# Altium schematic symbol library lib_datalogger.SchLib: 1246 symbols (part 2 of 16) (continued)
## CMP-002-00017-2
designator P?, comment 4-103777-0
Male Header, Pitch 2.54 mm, 2 x 40 Position, Height 8.13 mm, Tail Length 2.29 mm, -65 to 105 degC, RoHS, Bulk; Manufacturer: TE Connectivity; Rows: 2; Current Rating: 3A; Contact Material: Bronze; Contact Plating: Tin; Case/Package: 4-103777-0; Colour: Black; Packaging: Bulk; Datasheet URL: http://www.onlinecomponents.com/datasheet/41037770.aspx?p=10364676; Package Description: Male Header, Pitch 2.54 mm, 2 x 40 Position, Height 8.13 mm, Tail Length 2.29 mm; Datasheet Version: Rev. 6-04, 03/2006; Max Operating Temperature: 105°C; Contact Finish: Lead; RoHS Compliant: True; Package URL: http://www.mouser.com/ds/2/418/NG_CD_103777_F2-615203.pdf; Connector Type: Header; Lead Pitch: 2.54mm; Min Operating Temperature: -65°C; Gender: Male; Mounting Technology: TH; Pins: 80; Manufacturer URL: http://www.te.com/; Contact Gender: Male; Package Quantity: 50; Package Reference: 4-103777-0
footprint TECO-4-103777-0_V (THD, 80-Leads, Body 101.19x4.88mm, Pitch 2.54mm)
pins: 1, 2, 3, 4, 5, 6, 7, 8, 9, 10, 11, 12, 13, 14, 15, 16, 17, 18, 19, 20, 21, 22, 23, 24, 25, 26, 27, 28, 29, 30, 31, 32, 33, 34, 35, 36, 37, 38, 39, 40, 41, 42, 43, 44, 45, 46, 47, 48, 49, 50, 51, 52, 53, 54, 55, 56, 57, 58, 59, 60, 61, 62, 63, 64, 65, 66, 67, 68, 69, 70, 71, 72, 73, 74, 75, 76, 77, 78, 79, 80

## CMP-002-00018-2
designator P?, comment 5-146130-2
Male Header, Pitch 2.54 mm, 2 x 3 Position, Height 8.13 mm, -65 to 125 degC, RoHS, Tube; Manufacturer: TE Connectivity; Max Operating Temperature: 125°C; Datasheet Version: Oct-15; Package Description: Male Header, Pitch 2.54 mm, 2 x 3 Position, Height 8.13 mm; Case/Package: 5-146130-2; Datasheet URL: http://www.te.com/commerce/DocumentDelivery/DDEController?Action=showdoc&DocId=Customer+Drawing%7F146130%7FM%7Fpdf%7FEnglish%7FENG_CD_146130_M.pdf%7F5-146130-2; Manufacturer URL: http://www.te.com/; Connector Type: Header; Gender: Male; Mounting Technology: SM; Min Operating Temperature: -65°C; RoHS Compliant: Unknown; Package Reference: 5-146130-2
footprint TECO-5-146130-2_V (Header, 6-Leads, Body 7.21x4.88mm, Pitch 2.54mm)
pins: 1, 2, 3, 4, 5, 6

## CMP-002-00019-2
designator J?, comment 5-534237-8
Female Receptacle, Pitch 2.54 mm, 1 x 10 Position, Height 8.64 mm, Tail Length 2.92 mm, -65 to 105 degC, RoHS, Tube; Manufacturer: TE Connectivity; Max Contact Resistance: 12mohm; Connector Type: Header; Current Rating: 2A; Voltage Rating: 750V; Rows: 1; Datasheet Version: Apr-13; Contact Plating: Gold; Min Operating Temperature: -65°C; Manufacturer URL: http://www.te.com/; Mounting Technology: TH; Contact Material: Bronze; RoHS Compliant: True; Packaging: Rail/Tube; Contact Finish: Gold; Pins: 10; Case/Package: 5-534237-8; Max Operating Temperature: 105°C; Lead Pitch: 2.54mm; Gender: Female; Package Quantity: 22; Colour: Black; Package Description: Female Receptacle, Pitch 2.54 mm, 1 x 10 Position, Height 8.64 mm, Tail Length 2.92 mm; Package Reference: 5-534237-8; Datasheet URL: http://www.te.com/commerce/DocumentDelivery/DDEController?Action=showdoc&DocId=Customer+Drawing%7F534237%7FR5%7Fpdf%7FEnglish%7FENG_CD_534237_R5.pdf%7F5-534237-8
footprint TECO-5-534237-8_V (Receptacle, 10-Leads, Body 25.4x3.56mm, Pitch 2.54mm)
pins: 1, 2, 3, 4, 5, 6, 7, 8, 9, 10

## CMP-002-00020-2
designator P?, comment 68021-210HLF
Male Header, Pitch 2.54 mm, 2 x 5 Position, Height 4.83 mm, Tail Length 3.05 mm, Bulk; Manufacturer: FCI Electronics; Datasheet URL: http://portal.fciconnect.com/Comergent//fci/drawing/68020.pdf; Case/Package: 68021-210HLF-10; Manufacturer URL: http://portal.fciconnect.com/; Connector Type: Header; Mounting Technology: TH; Datasheet Version: Rev. BM, 04/2015; Package Description: Male Header, Pitch 2.54 mm, 2 x 5 Position, Height 4.83 mm, Tail Length 3.05 mm; Gender: Male; RoHS Compliant: Unknown; Package Reference: 68021-210HLF-10
footprint FCI-68021-210HLF-10_V (THD, 10-Leads, Body 12.7x2.54mm, Pitch 2.54mm)
pins: 1, 2, 3, 4, 5, 6, 7, 8, 9, 10

## CMP-002-00021-2
designator P?, comment 77311-462K05LF
Male Header, Pitch 2.54 mm, 1 x 5 Position, Height 16.24 mm, Tail Length 3.05 mm, -65 to 125 degC, RoHS, Tape and Reel; Manufacturer: FCI Electronics; Connector Type: Header; Manufacturer URL: http://portal.fciconnect.com/; Datasheet URL: http://portal.fciconnect.com/Comergent//fci/drawing/77311.pdf; Gender: Male; Case/Package: 77311-5; Package Reference: 77311-5; Datasheet Version: Rev. CK, 07/2016; Package Description: Male Header, Pitch 2.54 mm, 1 x 5 Position, Height 16.24 mm, Tail Length 3.05 mm; RoHS Compliant: Unknown; Mounting Technology: TH
footprint FCI-77311-5_V (THD, 5-Leads, Body 12.7x2.4mm, Pitch 2.54mm)
pins: 1 DTR, 2 RXI, 3 TXO, 4 VCC, 5 CTS

## CMP-002-00022-2
designator P?, comment 9-146281-0
Male Header, Pitch 2.54 mm, 1 x 40 Position, Height 8.21 mm, Tail Length 3.05 mm, -65 to 105 degC, RoHS, Bulk; Manufacturer: TE Connectivity; Current Rating: 3A; Rows: 1; Datasheet URL: http://www.te.com/commerce/DocumentDelivery/DDEController?Action=showdoc&DocId=Customer+Drawing%7F146281%7FG%7Fpdf%7FEnglish%7FENG_CD_146281_G_146281_1_c.dwg.pdf%7F9-146281-0; Contact Plating: Gold; Packaging: Tray; Lead Pitch: 2.54mm; Max Operating Temperature: 105°C; Manufacturer URL: http://www.te.com/; Connector Type: Header; Package Reference: 9-146281-0; Gender: Male; Package Description: Male Header, Pitch 2.54 mm, 1 x 40 Position, Height 8.21 mm, Tail Length 3.05 mm; Package Quantity: 100; Datasheet Version: Rev. G, 07/2014; Contact Gender: Male; Colour: Black; RoHS Compliant: True; Min Operating Temperature: -65°C; Mounting Technology: TH; Contact Material: Bronze; Package URL: http://www.te.com/commerce/DocumentDelivery/DDEController?Action=showdoc&DocId=Catalog+Section%7F1307819_SECTION_5%7F0908%7Fpdf%7FEnglish%7FENG_CS_1307819_SECTION_5_0908.pdf%7F9-146281-0; Case/Package: 9-146281-0; Contact Finish: Gold; Pins: 40
footprint TECO-9-146281-0_V (Header, 40-Leads, Body 101.2x2.34mm, Pitch 2.54mm)
pins: 1, 2, 3, 4, 5, 6, 7, 8, 9, 10, 11, 12, 13, 14, 15, 16, 17, 18, 19, 20, 21, 22, 23, 24, 25, 26, 27, 28, 29, 30, 31, 32, 33, 34, 35, 36, 37, 38, 39, 40

## CMP-002-00023-2
designator J?, comment 929850-01-10-RA
Female Header, Pitch 2.54 mm, 1 x 10 Position, Height 8.26 mm, Tail Length 3.18 mm, -40 to 105 degC, RoHS, Bulk; Manufacturer: 3M; Current Rating: 1A; Datasheet Version: Jun-13; Contact Finish: Gold; Package Description: Female Header, Pitch 2.54 mm, 1 x 10 Position, Height 8.26 mm, Tail Length 3.18 mm; Mounting Technology: TH; Max Operating Temperature: 105°C; Pins: 10; Lead Pitch: 2.54mm; RoHS Compliant: True; Contact Plating: Gold; Min Operating Temperature: -40°C; Colour: Black; Contact Gender: Female; Package Reference: 929850-01-10-RA; Gender: Female; Case/Package: 929850-01-10-RA; Packaging: Bulk; Package Quantity: 300; Datasheet URL: http://multimedia.3m.com/mws/media/22500O/3mtm-boardmount-skt-100-100x-100strt-sldr-tails-ts0815.pdf; Connector Type: Header; Contact Material: Copper; Manufacturer URL: http://www.3m.com/
footprint 3M-929850-01-10-RA_V (THD, 10-Leads, Body 25.4x2.54mm, Pitch 2.54mm)
pins: 1, 2, 3, 4, 5, 6, 7, 8, 9, 10

## CMP-002-00024-2
designator P?, comment 95278-101A06LF
Male Header, Pitch 2.54 mm, 2 x 3 Position, Height 14.4 mm, RoHS, Tape and Reel; Manufacturer: Amphenol; Package Reference: 95278-101A06LF; Package Description: Male Header, Pitch 2.54 mm, 2 x 3 Position, Height 14.4 mm; RoHS Compliant: Unknown; Case/Package: 95278-101A06LF; Connector Type: Header; Mounting Technology: SM; Gender: Male; Datasheet URL: http://portal.fciconnect.com/Comergent//fci/drawing/95278.pdf; Datasheet Version: Rev. AC, 03/2016
footprint AMPM-95278-101A06LF_V (SMD, 6-Leads, Body 7.26x4.83mm, Pitch 2.54mm)
pins: 1, 2, 3, 4, 5, 6

## CMP-002-00025-2
designator P?, comment B2P-VH(LF)(SN)
Male Header, Pitch 3.96 mm, 1 x 2 Position, Height 10.9 mm, Tail Length 3.7 mm, -25 to 85 degC, RoHS, Bulk; Manufacturer: JST; Case/Package: B2P-VH(LF)(SN); Connector Type: Header; Mounting Technology: TH; Package Reference: B2P-VH(LF)(SN); Package Description: Male Header, Pitch 3.96 mm, 1 x 2 Position, Height 10.9 mm, Tail Length 3.7 mm; Max Operating Temperature: 85°C; Manufacturer URL: http://www.jst.com/home2.html; RoHS Compliant: Unknown; Datasheet Version: May-16; Gender: Male; Min Operating Temperature: -25°C; Datasheet URL: http://www.jst-mfg.com/product/pdf/eng/eVH.pdf
footprint JST-B2P-VH(LF)(SN)_V (THD, 2-Leads, Body 8.5x7.86mm, Pitch 3.96mm)
pins: 1, 2

## CMP-002-00026-2
designator P?, comment B3P-VH(LF)(SN)
Male Header, Pitch 3.96 mm, 1 x 3 Position, Height 10.9 mm, Tail Length 3.7 mm, -25 to 85 degC, RoHS, Bulk; Manufacturer: JST; Case/Package: B3P-VH(LF)(SN); Connector Type: Header; Datasheet Version: May-16; Mounting Technology: TH; Package Description: Male Header, Pitch 3.96 mm, 1 x 3 Position, Height 10.9 mm, Tail Length 3.7 mm; Gender: Male; Manufacturer URL: http://www.jst.com/home2.html; Package Reference: B3P-VH(LF)(SN); Datasheet URL: http://www.jst-mfg.com/product/pdf/eng/eVH.pdf; Min Operating Temperature: -25°C; Max Operating Temperature: 85°C; RoHS Compliant: Unknown
footprint JST-B3P-VH(LF)(SN)-3_V (Connector, 3-Leads, Body 8.5x11.82mm, Pitch 3.96mm)
pins: 1, 2, 3

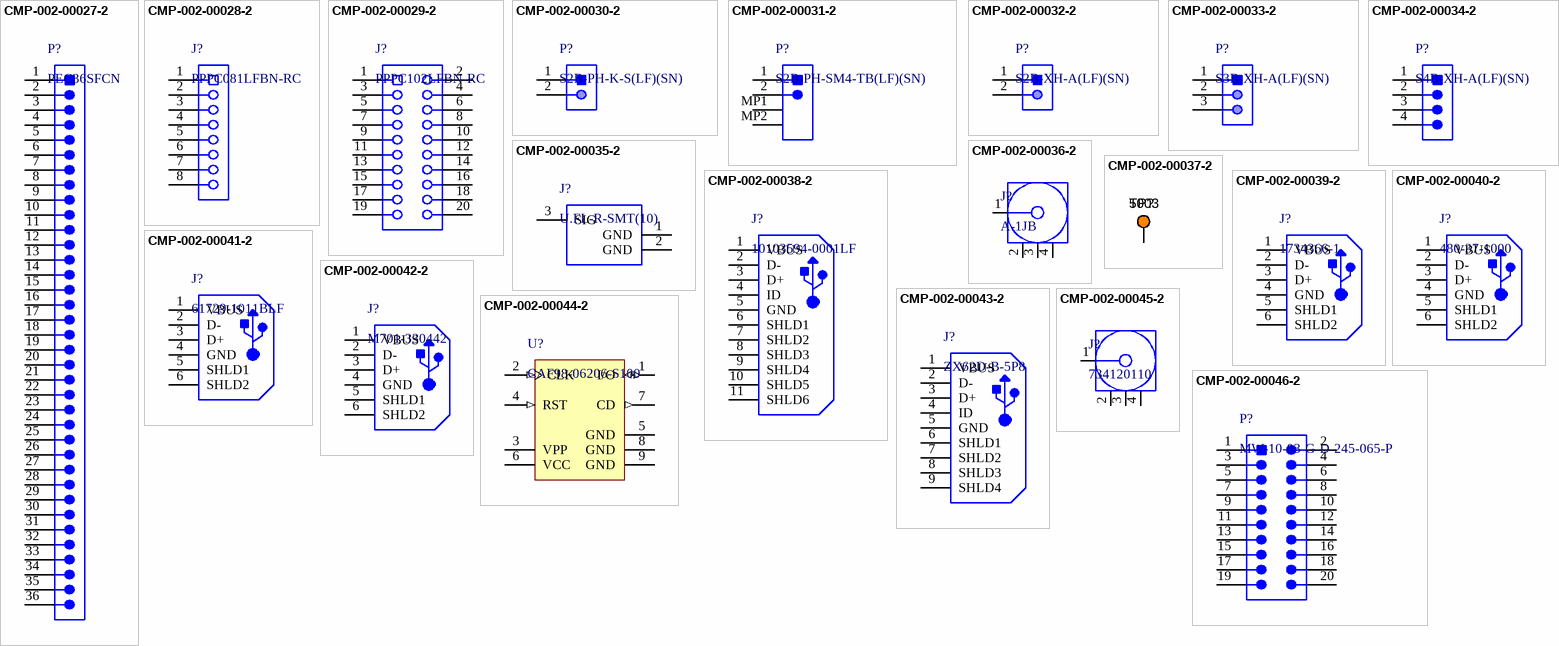
[diagram p4: symbols CMP-002-00027-2 to CMP-002-00046-2]

## CMP-002-00027-2
designator P?, comment PEC36SFCN
Male Header, Pitch 2.54 mm, 1 x 36 Position, Height 10.62 mm, Tail Length 8.13 mm, -65 to 125 degC, RoHS, Bulk; Manufacturer: Sullins; Contact Finish: Tin; Datasheet Version: Apr-13; Pins: 36; Datasheet URL: http://disti-assets.s3.amazonaws.com/testco-inc/files/datasheets/17515.pdf; RoHS Compliant: True; Case/Package: PEC36SFCN; Package Reference: PEC36SFCN; Colour: Black; Gender: Male; Connector Type: Header; Package Quantity: 1; Packaging: Bulk; Mounting Technology: TH; Package Description: Male Header, Pitch 2.54 mm, 1 x 36 Position, Height 10.62 mm, Tail Length 8.13 mm; Package URL: http://www.sullinscorp.com/drawings/77____C___S___N-OMIT,_M500,_STRAIGHT,_C10436.pdf; Lead Pitch: 0.1inch
footprint SLIN-PEC36SFCN_V (THD, 36-Leads, Body 91.44x2.54mm, Pitch 2.54mm)
pins: 1, 2, 3, 4, 5, 6, 7, 8, 9, 10, 11, 12, 13, 14, 15, 16, 17, 18, 19, 20, 21, 22, 23, 24, 25, 26, 27, 28, 29, 30, 31, 32, 33, 34, 35, 36

## CMP-002-00028-2
designator J?, comment PPPC081LFBN-RC
Female Header, Pitch 2.54 mm, 1 x 8 Position, Height 8.5 mm, Tail Length 3.2 mm, -40 to 105 degC, RoHS, Bulk; Manufacturer: Sullins; Package Reference: PPPC081LFBN-RC; Connector Type: Header; Datasheet Version: Jan-15; Package Description: Female Header, Pitch 2.54 mm, 1 x 8 Position, Height 8.5 mm, Tail Length 3.2 mm; RoHS Compliant: Unknown; Max Operating Temperature: 105°C; Case/Package: PPPC081LFBN-RC; Min Operating Temperature: -40°C; Datasheet URL: http://sullinscorp.com/catalogs/101_PAGE114-115_.100_FEMALE_HDR.pdf; Gender: Female; Mounting Technology: TH
footprint SLIN-PPPC081LFBN-RC_V (THD, 8-Leads, Body 20.82x2.54mm, Pitch 2.54mm)
pins: 1, 2, 3, 4, 5, 6, 7, 8

## CMP-002-00029-2
designator J?, comment PPPC102LFBN-RC
Female Header, Pitch 2.54 mm, 2 x 10 Position, Height 8.75 mm, Tail Length 3.2 mm, -40 to 105 degC, RoHS, Bulk; Manufacturer: Sullins; Mounting Technology: TH; RoHS Compliant: Unknown; Gender: Female; Case/Package: PPPC102LFBN-RC; Min Operating Temperature: -40°C; Datasheet Version: Rev. D, 10/2007; Max Operating Temperature: 105°C; Package Description: Female Header, Pitch 2.54 mm, 2 x 10 Position, Height 8.75 mm, Tail Length 3.2 mm; Package Reference: PPPC102LFBN-RC; Connector Type: Header; Datasheet URL: http://datasheet.octopart.com/PPPC102LFBN-RC-Sullins-datasheet-8327184.pdf
footprint SLIN-PPPC102LFBN-RC_V (THD, 20-Leads, Body 25.9x5mm, Pitch 2.54mm)
pins: 1, 2, 3, 4, 5, 6, 7, 8, 9, 10, 11, 12, 13, 14, 15, 16, 17, 18, 19, 20

## CMP-002-00030-2
designator P?, comment S2B-PH-K-S(LF)(SN)
Male Header, Pitch 2 mm, 1 x 2 Position, Height 4.8 mm, Tail Length 3.4 mm, -25 to 85 degC, RoHS, Bulk; Manufacturer: Japan Solderless Terminals; Package Reference: S2B-PH-K-S; Case/Package: S2B-PH-K-S; Datasheet URL: http://www.jst-mfg.com/product/pdf/eng/ePH.pdf; RoHS Compliant: Unknown; Datasheet Version: Dec-12; Gender: Male; Min Operating Temperature: -25°C; Max Operating Temperature: 85°C; Package Description: Male Header, Pitch 2 mm, 1 x 2 Position, Height 4.8 mm, Tail Length 3.4 mm; Connector Type: Header; Mounting Technology: SM
footprint JST-S2B-PH-K-S_V (THD, 2-Leads, Body 7.6x5.9mm, Pitch 2mm)
pins: 1, 2

## CMP-002-00031-2
designator P?, comment S2B-PH-SM4-TB(LF)(SN)
Male Header, Pitch 2 mm, 1 x 2 Position, Height 5.5 mm, -25 to 85 degC, RoHS, Tape and Reel; Manufacturer: JST; Package Reference: S2B-PH-SM4-TB(LF)(SN)-2; Mounting Technology: SM; Manufacturer URL: http://www.jst.com/home2.html; Package Description: Male Header, Pitch 2 mm, 1 x 2 Position, Height 5.5 mm; Max Operating Temperature: 85°C; Case/Package: S2B-PH-SM4-TB(LF)(SN)-2; Datasheet URL: http://www.jst-mfg.com/product/pdf/eng/ePH.pdf; Connector Type: Header; RoHS Compliant: Unknown; Datasheet Version: Dec-12; Gender: Male; Min Operating Temperature: -25°C
footprint JST- S2B-PH-SM4-TB(LF)(SN)-2_V (SMD, 2-Leads, Body 7.9x7.6mm, Pitch 2mm)
pins: 1, 2, MP1, MP2

## CMP-002-00032-2
designator P?, comment S2B-XH-A(LF)(SN)
Male Header, Pitch 2.5 mm, 1 x 2 Position, Height 6.1 mm, Tail Length 3.4 mm, -25 to 85 degC, RoHS, Bulk; Manufacturer: JST; Case/Package: S2B-XH-A(LF)(SN); Package Description: XH Series Disconnectable Crimp Style Connector, Pitch 2.5 mm, 1 x 2 Position, Height 6.1 mm, Tail Length 3.4 mm; Manufacturer URL: http://www.jst.com/home2.html; Datasheet URL: http://www.jst-mfg.com/product/pdf/eng/eXH.pdf; Connector Type: Header; Package Reference: S2B-XH-A(LF)(SN); Mounting Technology: TH; Max Operating Temperature: 85°C; Min Operating Temperature: -25°C; Datasheet Version: May-16; Gender: Male; RoHS Compliant: Unknown
footprint JST-S2B-XH-A(LF)(SN)_V (Header, 2-Leads, Body 7.4x11.5mm, Pitch 2.5mm)
pins: 1, 2

## CMP-002-00033-2
designator P?, comment S3B-XH-A(LF)(SN)
Male Header, Pitch 2.5 mm, 1 x 3 Position, Height 6.1 mm, Tail Length 3.4 mm, -25 to 85 degC, RoHS, Bulk; Manufacturer: JST; Package Description: Male Header, Pitch 2.5 mm, 1 x 3 Position, Height 6.1 mm, Tail Length 3.4 mm; Manufacturer URL: http://www.jst.com/home2.html; Datasheet URL: http://www.jst-mfg.com/product/pdf/eng/eXH.pdf; RoHS Compliant: Unknown; Connector Type: Header; Package Reference: S3B-XH-A(LF)(SN); Gender: Male; Case/Package: S3B-XH-A(LF)(SN); Mounting Technology: TH; Max Operating Temperature: 85°C; Min Operating Temperature: -25°C; Datasheet Version: May-16
footprint JST-S3B-XH-A(LF)(SN)_V (Header, 3-Leads, Body 9.9x11.5mm, Pitch 2.5mm)
pins: 1, 2, 3

## CMP-002-00034-2
designator P?, comment S4B-XH-A(LF)(SN)
Male Header, Pitch 2.5 mm, 1 x 4 Position, Height 6.1 mm, Tail Length 3.4 mm, -25 to 85 degC, RoHS, Bulk; Manufacturer: JST; Manufacturer URL: http://www.jst.com/home2.html; RoHS Compliant: Unknown; Gender: Male; Min Operating Temperature: -25°C; Datasheet URL: http://www.jst-mfg.com/product/pdf/eng/eXH.pdf; Case/Package: S4B-XH-A(LF)(SN); Datasheet Version: May-16; Mounting Technology: TH; Package Reference: S4B-XH-A(LF)(SN); Max Operating Temperature: 85°C; Package Description: XH Series Disconnectable Crimp Style Connector, Pitch 2.5 mm, 1 x 4 Position, Height 6.1 mm, Tail Length 3.4 mm; Connector Type: Header
footprint JST-S4B-XH-A(LF)(SN)_V (Header, 4-Leads, Body 12.4x11.5mm, Pitch 2.5mm)
pins: 1, 2, 3, 4

## CMP-002-00035-2
designator J?, comment U.FL-R-SMT(10)
Ultra Small Surface Mount Coaxial Connector, 50 Ohm, -40 to 90 degC, 3-Pin SMD, RoHS, Tape and Reel; Manufacturer: Hirose Electric; Impedance: 50Ohm; Connector Type: RF&Coax; RoHS Compliant: True; Datasheet Version: Aug-16; Contact Material: Brass; Packaging: TapeandReel; Mounting Technology: SM; Package Description: 3-Pin Surface Mount Device, Body 2.6 x 2.6 mm; Max Operating Temperature: 90°C; Datasheet URL: https://www.hirose.com/product/en/download_file/key_name/U.FL/category/Catalog/doc_file_id/31697/?file_category_id=4&item_id=15&is_series=1; Package Reference: U.FL-R-SMT; Contact Plating: Gold; Min Operating Temperature: -40°C; Fastening Type: Snap; Package Quantity: 2500; Resistance: 50Ohm; Manufacturer URL: https://www.hirose.com; Case/Package: U.FL-R-SMT
footprint HRS-U.FL-R-SMT_V (SMD, 3-Leads, Body 2.6x2.6mm)
pins: 1 GND (power), 2 GND (power), 3 SIG

## CMP-002-00036-2
designator J?, comment A-1JB
AMC PCB Jack, 0 to 60 GHz, 60 V, -40 to 90 degC, 4-Pin SMD, RoHS, Tape and Reel; Manufacturer: Amphenol; Connector Type: TerminalBlock; Mating Cycles: 30; Impedance: 50Ohm; Frequency: 6Hz; Min Operating Temperature: -40°C; Contact Material: Brass; Max Operating Temperature: 155°C; Datasheet URL: http://drawings.amphenolrf.com/Customer_Outline/CA-1JB.pdf; RoHS Compliant: True; Contact Plating: Gold; Package Reference: A-1JB; Packaging: TapeandReel; Case/Package: A-1JB; Fastening Type: Snap; Mounting Technology: SM; Datasheet Version: Rev. K, 05/2016; Package Quantity: 2500; Package Description: 4-Pin Surface Mount Device, Body 2.6 x 2.6 mm
footprint AMPH-A-1JB_V (SMD, 4-Leads, Body 2.6x2.6mm)
pins: 1, 2, 3, 4

## CMP-002-00037-2
designator TP?, comment 5003
Test Point, Orange, Height 4.6 mm, Tail Length 3 mm, 1-Pin THD, RoHS; Manufacturer: Keystone; Colour: Orange; Packaging: Bulk; Package Description: 1-Pin Through Hole Device, Dia 2.54 mm; Pins: 1; Package Reference: 5003; Datasheet Version: Jun-15; Case/Package: 5003; Mounting Technology: TH; Connector Type: TestPoint; Diameter: 2.54mm; Contact Material: Bronze; Datasheet URL: http://keyelco.com/userAssets/file/M65p56.pdf; Manufacturer URL: http://www.keyelco.com/; Package Quantity: 10; Contact Plating: Tin; RoHS Compliant: True
footprint KSTN-5003 (Test Point, Through Hole, Dia 2.54mm)
pins: 1

## CMP-002-00038-2
designator J?, comment 10103594-0001LF
Micro USB 2.0 B Receptacle, 5 Position, Height 3.24 mm, -55 to 85 degC, RoHS, Tape and Reel; Manufacturer: FCI Electronics; Gender: Female; Current Rating: 1.8A; Voltage Rating: 100V; Min Operating Temperature: -55°C; Package Reference: FCI-10103594-0001LF; Max Operating Temperature: 85°C; Lead Pitch: 0.65mm; Case/Package: FCI-10103594-0001LF; Package Quantity: 1500; Connector Type: USB; Mounting Technology: SM; Datasheet Version: Rev. A, 06/2010; Contact Material: Copper; Package Description: 5-Pin Surface Mount Device, Body 8.04 x 5.62 mm; Contact Plating: Gold; Packaging: TapeandReel; Datasheet URL: http://portal.fciconnect.com/Comergent//fci/drawing/10103594.pdf; Pins: 5; RoHS Compliant: True; Manufacturer URL: http://portal.fciconnect.com/
footprint FCI-10103594-0001LF_V (SMD, 5-Leads, Body 8.04x5.62mm, Pitch 0.65 mm)
pins: 1 VBUS, 2 D-, 3 D+, 4 ID, 5 GND, 6 SHLD1, 7 SHLD2, 8 SHLD3, 9 SHLD4, 10 SHLD5, 11 SHLD6

## CMP-002-00039-2
designator J?, comment 1734366-1
Recept Assy Type A USB, 4 Position, Height 15 mm, -55 to 85 degC, RoHS, Tray; Manufacturer: TE Connectivity; Voltage Rating: 30V; Gender: Female; Current Rating: 1A; Manufacturer URL: http://www.te.com/; Packaging: Tray; Package Quantity: 24000; Pins: 4; Package Description: 6-Pin Through Hole Device, Length 15 mm, Height 15 mm, Tail Length 2.8 mm; Colour: Black; Max Operating Temperature: 50°C; Datasheet Version: Rev. C3, 03/2016; Contact Plating: Gold; Case/Package: 1734366-1; RoHS Compliant: True; Min Operating Temperature: 0°C; Voltage Rating (AC): 30V; Connector Type: USB; Package Reference: 1734366-1; Contact Material: Copper; Max Voltage Rating (AC): 30V; Datasheet URL: http://www.te.com/commerce/DocumentDelivery/DDEController?Action=showdoc&DocId=Customer+Drawing%7F1734366%7FC3%7Fpdf%7FEnglish%7FENG_CD_1734366_C3.pdf%7F1734366-1; Mounting Technology: TH
footprint TE-1734366-1_V (Connector, 6-Leads, Body 7.62x15mm)
pins: 1 VBUS, 2 D-, 3 D+, 4 GND, 5 SHLD1, 6 SHLD2

## CMP-002-00040-2
designator J?, comment 480-37-1000
Universal Serial Bus (USB) Shielded I/O Plug, Type A, Right Angle Connector, 4 Position, Height 4.6 mm, -20 to 85 degC, RoHS, Tray; Manufacturer: Molex; Gender: Male; Voltage Rating (AC): 150V; Max Current Rating: 1.5A; Package Description: 4-Pin Surface Mount Device, Body 12 x 18.8 mm; Max Operating Temperature: 85°C; Mounting Technology: SM; Contact Material: Brass; Case/Package: 480-37-1000; Connector Type: USB; Contact Plating: Gold; RoHS Compliant: True; Colour: Black; Datasheet URL: http://www.molex.com/pdm_docs/sd/480371000_sd.pdf; Manufacturer URL: http://www.molex.com/; Max Voltage Rating (AC): 150V; Datasheet Version: Rev. D, 06/2004; Current Rating: 1.5A; Min Operating Temperature: -20°C; Pins: 4; Package Reference: 480-37-1000; Packaging: Tray
footprint MOLX-480-37-1000_V (CONN, 4-Leads, Body 12x18.8mm)
pins: 1 VBUS, 2 D-, 3 D+, 4 GND, 5 SHLD1, 6 SHLD2

## CMP-002-00041-2
designator J?, comment 61729-1011BLF
USB Receptacle B Type, Right Angle, 4 Position, Height 11.5 mm,-40 to 85 degC, RoHS, Tube; Manufacturer: FCI Electronics; Current Rating: 1.5A; Gender: Female; Contact Material: Copper; Contact Plating: Nickel; Colour: Black; Max Operating Temperature: 40°C; Datasheet URL: http://portal.fciconnect.com/Comergent/fci/drawing/61729.pdf; Pins: 4; Lead Pitch: 2.5mm; Mounting Technology: TH; Packaging: Rail/Tube; Package Description: 4-Pin Through Hole Device, Body 16 x 12.2 mm; RoHS Compliant: True; Case/Package: 61729-1011BLF; Package Quantity: 44; Manufacturer URL: http://portal.fciconnect.com/; Package Reference: 61729-1011BLF; Datasheet Version: Rev. W, 05/2014; Connector Type: USB; Min Operating Temperature: 0°C
footprint FCI-61729-1011BLF_V (THD, 4-Leads, Body 16x12.2mm)
pins: 1 VBUS, 2 D-, 3 D+, 4 GND, 5 SHLD1, 6 SHLD2

## CMP-002-00042-2
designator J?, comment M701-330442
Single USB 2.0, Receptacle Connecter, B Type, Through Hole, 4 Position, Height 16.25 mm, -55 to 85 degC, RoHS, Tray; Manufacturer: Harwin; Current Rating: 1.5A; Gender: Female; Datasheet Version: Oct-15; Package Reference: M701-330442; Packaging: Tray; Pins: 4; Colour: White; Contact Plating: Gold; Contact Material: Bronze; RoHS Compliant: True; Case/Package: M701-330442; Mounting Technology: TH; Lead Pitch: 2.5mm; Datasheet URL: https://cdn.harwin.com/pdfs/M701-330442.pdf; Connector Type: USB; Min Operating Temperature: -55°C; Package Description: USB Connecter, 4 Position Through Hole, Length 12.04 mm, Height 16.25 mm, Tail Length 3.1 mm; Package Quantity: 100; Max Operating Temperature: 85°C
footprint HRWN-M701-330442_V (USB, 4-Leads, Body 12.04x10.6mm, Pitch 2.5mm)
pins: 1 VBUS, 2 D-, 3 D+, 4 GND, 5 SHLD1, 6 SHLD2

## CMP-002-00043-2
designator J?, comment ZX62D-B-5P8
Right Angle Receptacle Connector, Micro USB, 5 Position, Height 2.65 mm, -30 to 85 degC, RoHS, Tape and Reel; Manufacturer: Hirose Electric; Gender: Male; Rows: 1; Current Rating: 1A; Max Operating Temperature: 85°C; Package Quantity: 2000; Connector Type: USB; Datasheet Version: Aug-16; Contact Material: Copper; Packaging: TapeandReel; Package URL: https://www.hirose.com/product/en/download_file/key_name/ZX62D-B-5P8/category/Drawing%20(2D)/doc_file_id/36535/?file_category_id=6&item_id=02420034000&is_series=; Min Operating Temperature: -30°C; Case/Package: ZX62D-B-5P8; Package Reference: ZX62D-B-5P8; Pins: 5; Mounting Technology: SM; Package Description: USB Connector, 5 Position Surface Mount, Length 8 mm, Height 2.65 mm; Housing Material: Plastic; Datasheet URL: https://www.hirose.com/product/en/download_file/key_name/ZX62D-B-5P8/category/Catalog/doc_file_id/31704/?file_category_id=5&item_id=02420034000&is_series=; Contact Plating: Gold; Lead Pitch: 0.65mm; RoHS Compliant: True; Manufacturer URL: https://www.hirose.com
footprint HIRO-ZX62D-B-5P8_V (Micro-USB Connector, 9-Leads, Body 7.5x5.6mm, Pitch 0.65mm)
pins: 1 VBUS, 2 D-, 3 D+, 4 ID, 5 GND, 6 SHLD1, 7 SHLD2, 8 SHLD3, 9 SHLD4

## CMP-002-00044-2
designator U?, comment CAF98-06206-S100